# Altium schematic symbol library LATTICEPLDS_Library.SchLib: 291 symbols (part 2 of 32) (continued)
## iCE40LP8K-CM121
designator U?
SPLIT_INST: TRUE; SWAP_INFO: (S1+S2+S3+S4+S5+S6)
part A pins: A1 IOT_225 (io), A2 IOT_222 (io), A3 IOT_223 (io), A4 IOT_211 (io), A5 IOT_207 (io), A6 IOT_206 (io), A7 IOT_192 (io), A8 IOT_190 (io), A9 IOT_178 (io), A10 IOT_170 (io), A11 IOT_168 (io), B3 IOT_221 (io), B4 IOT_219 (io), B5 IOT_208 (io), B6 IOT_198_GBIN0 (io), B7 IOT_197_GBIN1 (io), B8 IOT_177 (io), B9 IOT_174 (io), C7 IOT_191 (io), C8 IOT_179 (io), C9 IOT_172 (io), D5 IOT_212 (io), D6 VCCIO_0 (power), D7 IOT_181 (io)
part B pins: B11 IOR_161 (io), C11 IOR_160 (io), D9 IOR_147 (io), D10 IOR_154 (io), D11 IOR_152 (io), E8 IOR_146 (io), E9 IOR_144 (io), E10 IOR_141_GBIN2 (io), E11 IOR_148 (io), F8 VCCIO_1 (power), F9 IOR_137 (io), F10 IOR_136 (io), F11 IOR_140_GBIN3 (io), G8 IOR_118 (io), G9 IOR_128 (io), G10 IOR_120 (io), G11 IOR_129 (io), H10 IOR_116 (io), H11 IOR_119 (io), J10 IOR_117 (io), J11 IOR_114 (io), K11 IOR_115 (io)
part C pins: H6 VCCIO_2 (power), H7 IOB_87 (io), H9 IOB_104_CBSEL1 (io), J3 IOB_57 (io), J4 IOB_64 (io), J5 IOB_78 (io), J7 IOB_86 (io), J8 IOB_91 (io), K3 IOB_63 (io), K4 IOB_73 (io), K5 IOB_79 (io), K6 IOB_82_GBIN4 (io), K7 IOB_89 (io), K8 CDONE (io), L1 IOB_56 (io), L2 IOB_61 (io), L3 IOB_71 (io), L4 IOB_72 (io), L5 IOB_81_GBIN5 (io), L7 IOB_94 (io), L8 IOB_103_CBSEL0 (io), L9 CRESET_B (io)
part D pins: B1 IOL_2A (io), B2 IOL_2B (io), C1 IOL_5B (io), C2 IOL_5A (io), C3 IOL_4B (io), C4 IOL_4A (io), D1 IOL_8B (io), D2 IOL_9A (io), D3 IOL_9B (io), E1 IOL_8A (io), E2 IOL_10A (io), E3 IOL_10B (io), E4 VCCIO_3 (power), F1 IOL_12A (io), F2 IOL_12B (io), F3 IOL_13B_GBIN7 (io), F4 IOL_13A (io), G1 IOL_14A_GBIN6 (io), G2 IOL_14B (io), G3 IOL_17A (io), G4 VCCIO_3 (power), H1 IOL_18A (io), H2 IOL_18B (io), H3 IOL_17B (io), J1 IOL_23A (io), J2 IOL_25B (io), K1 IOL_23B (io), K2 IOL_25A (io)
part E pins: J9 IOB_106_SDI (io), K9 IOB_105_SDO (io), K10 IOB_108_SS (io), L10 IOB_107_SCK (io), L11 VCC_SPI (power)
part F pins: B10 VPP_FAST (power), C5 GNDPLL1 (power), C6 VCCPLL1 (power), C10 VPP_2V5 (power), D4 VCC (power), D8 VCC (power), E5 GND (power), E6 GND (power), E7 GND (power), F5 GND (power), F6 GND (power), F7 GND (power), G5 GND (power), G6 GND (power), G7 GND (power), H4 VCC (power), H5 GND (power), H8 VCC (power), J6 VCCPLL0 (power), L6 GNDPLL0 (power)
part A text: BANK0
part B text: BANK1
part C text: BANK2
part D text: BANK3
part E text: SPI
part F text: POWER

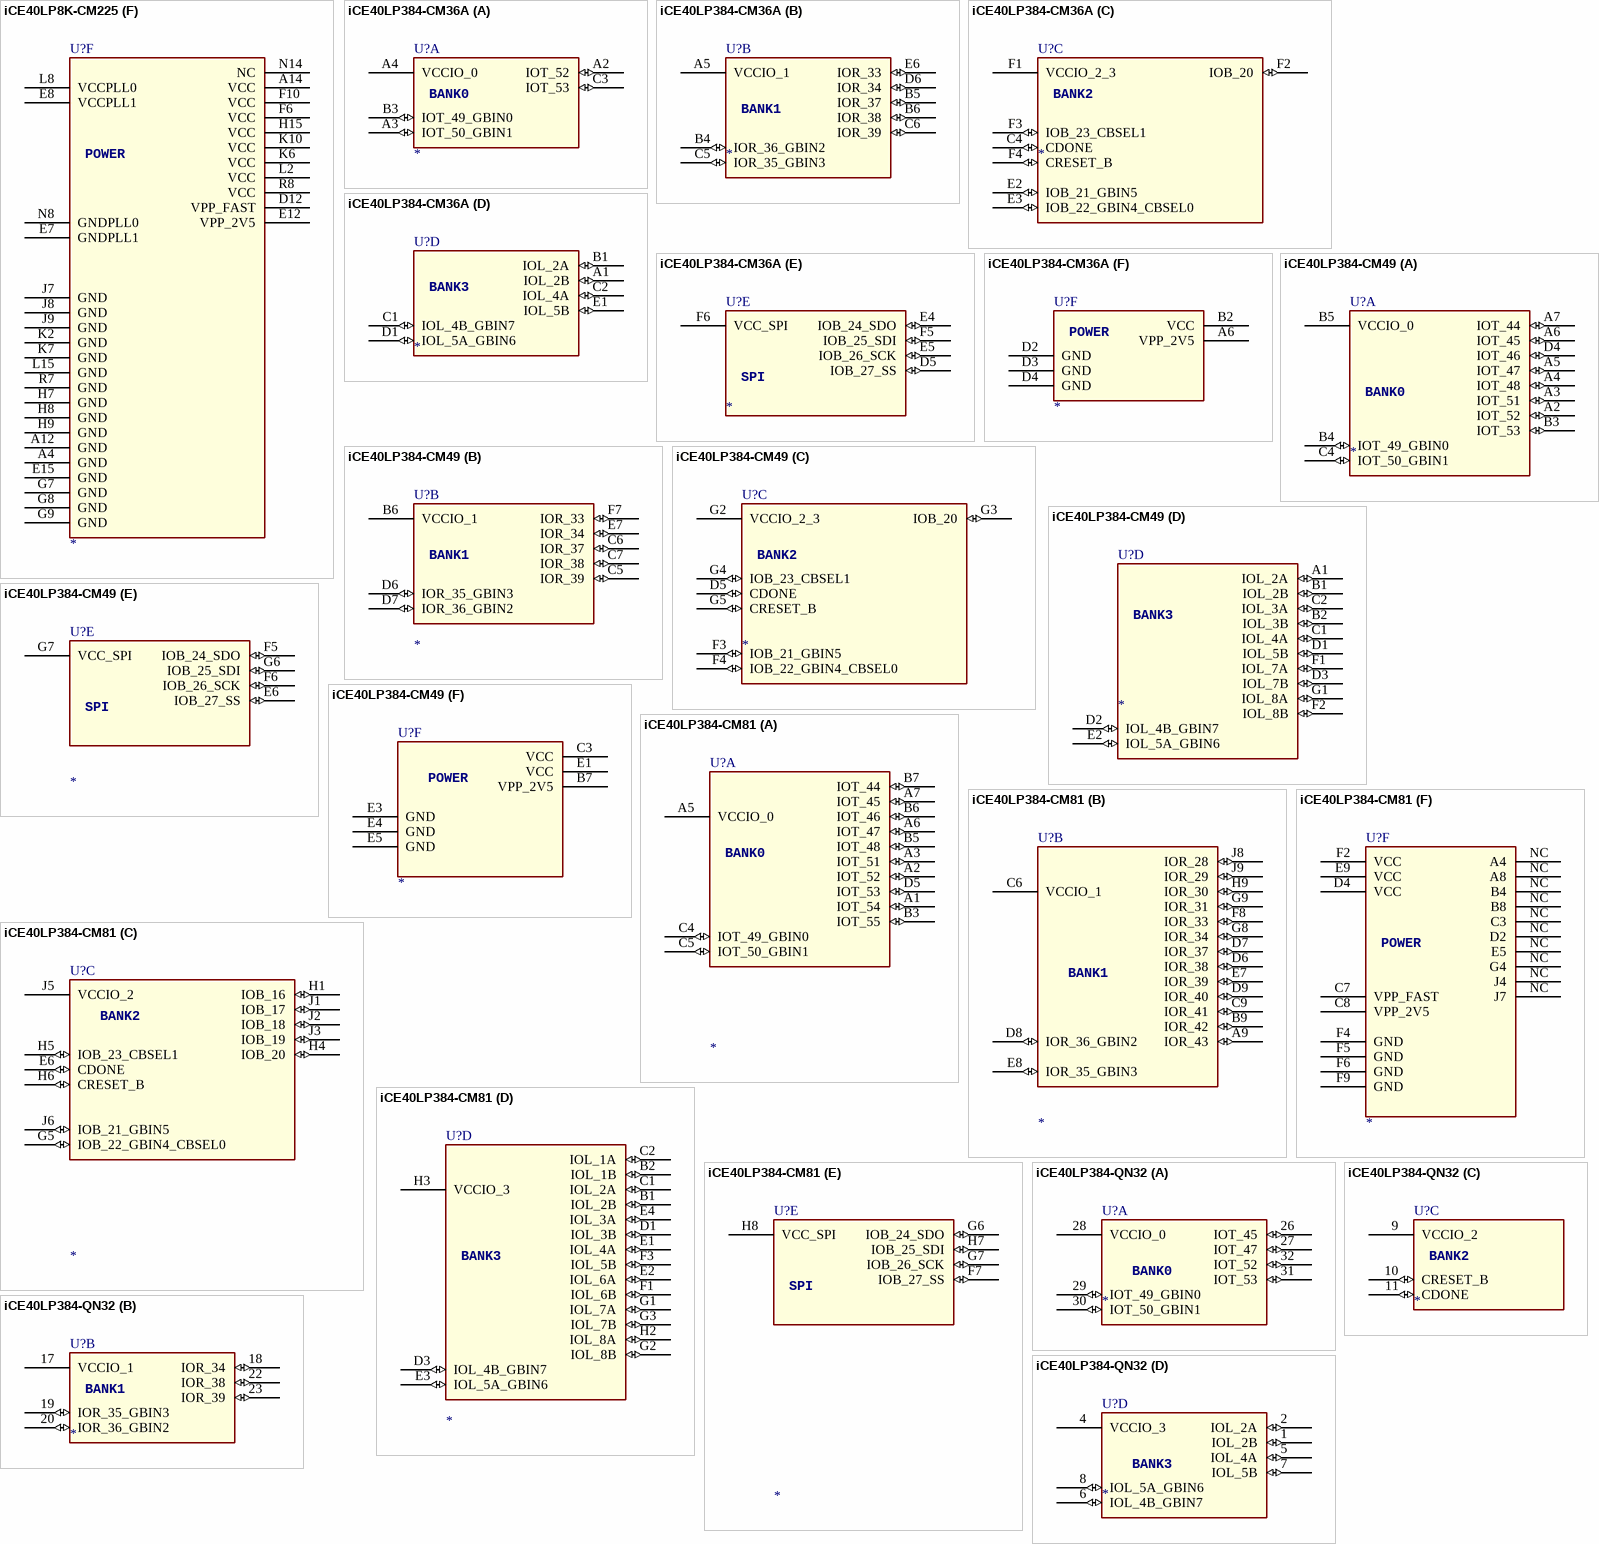
[diagram p14: symbols iCE40LP8K-CM225 to iCE40LP384-QN32]

## iCE40LP8K-CM225
designator U?
SPLIT_INST: TRUE; SWAP_INFO: (S1+S2+S3+S4+S5+S6)
part A pins: A1 IOT_226 (io), A2 IOT_222 (io), A3 VCCIO_0 (power), A5 IOT_216 (io), A6 IOT_207 (io), A7 IOT_205 (io), A8 IOT_196 (io), A9 IOT_194 (io), A10 IOT_189 (io), A11 IOT_184 (io), A13 VCCIO_0 (power), A15 IOT_169 (io), B2 IOT_224 (io), B3 IOT_220 (io), B4 IOT_218 (io), B5 IOT_214 (io), B6 IOT_209 (io), B7 IOT_201 (io), B8 IOT_192 (io), B9 IOT_195 (io), B10 IOT_187 (io), B11 IOT_185 (io), B12 IOT_180 (io), B13 IOT_176 (io), B14 IOT_168 (io), C3 IOT_225 (io), C4 IOT_223 (io), C5 IOT_219 (io), C6 IOT_203 (io), C7 IOT_206 (io), C8 IOT_193 (io), C9 IOT_197_GBIN1 (io), C10 IOT_191 (io), C11 IOT_182 (io), C12 IOT_170 (io), C13 IOT_171 (io), D5 IOT_221 (io), D6 IOT_211 (io), D7 IOT_208 (io), D8 IOT_198_GBIN0 (io), D9 IOT_178 (io), D10 IOT_181 (io), D11 IOT_174 (io), E9 IOT_179 (io), E10 IOT_177 (io), E11 IOT_172 (io), F7 IOT_212 (io), F8 VCCIO_0 (power), F9 IOT_190 (io)
part B pins: B15 IOR_167 (io), C14 IOR_165 (io), C15 VCCIO_1 (power), D13 IOR_160 (io), D14 IOR_155 (io), D15 IOR_159 (io), E13 IOR_161 (io), E14 IOR_153 (io), F11 IOR_154 (io), F12 IOR_152 (io), F13 IOR_151 (io), F14 IOR_147 (io), F15 IOR_149 (io), G10 IOR_146 (io), G11 IOR_144 (io), G12 IOR_148 (io), G13 IOR_141_GBIN2 (io), G14 IOR_145 (io), G15 IOR_143 (io), H10 VCCIO_1 (power), H11 IOR_136 (io), H12 IOR_140_GBIN3 (io), H13 IOR_138 (io), H14 IOR_137 (io), J10 IOR_118 (io), J11 IOR_128 (io), J12 IOR_120 (io), J13 IOR_129 (io), J14 IOR_135 (io), J15 IOR_133 (io), K12 IOR_116 (io), K13 IOR_117 (io), K14 IOR_131 (io), K15 IOR_125 (io), L12 IOR_114 (io), L13 IOR_119 (io), L14 IOR_121 (io), M13 IOR_115 (io), M14 IOR_123 (io), M15 IOR_113 (io), N15 VCCIO_1 (power), P14 IOR_112 (io), P15 IOR_110 (io), R14 IOR_111 (io), R15 IOR_109 (io)
part C pins: K8 VCCIO_2 (power), K9 IOB_87 (io), K11 IOB_103_CBSEL0 (io), L5 IOB_56 (io), L6 IOB_62 (io), L7 IOB_72 (io), L9 IOB_82_GBIN4 (io), L10 IOB_89 (io), M5 IOB_60 (io), M6 IOB_64 (io), M7 IOB_75 (io), M8 IOB_78 (io), M9 IOB_85 (io), M10 CDONE (io), N3 IOB_52 (io), N4 IOB_54 (io), N5 IOB_67 (io), N6 IOB_73 (io), N7 IOB_81_GBIN5 (io), N9 IOB_86 (io), N10 IOB_91 (io), N11 CRESET_B (io), P2 IOB_53 (io), P3 VCCIO_2 (power), P4 IOB_63 (io), P5 IOB_69 (io), P6 IOB_77 (io), P7 IOB_83 (io), P8 IOB_84 (io), P9 IOB_90 (io), P10 IOB_92 (io), P11 IOB_96 (io), P12 IOB_104_CBSEL1 (io), P13 IOB_100 (io), R1 IOB_55 (io), R2 IOB_57 (io), R3 IOB_61 (io), R4 IOB_65 (io), R5 IOB_71 (io), R6 IOB_79 (io), R9 IOB_88 (io), R10 IOB_94 (io), R11 IOB_98 (io), R12 IOB_102 (io), R13 VCCIO_2 (power)
part D pins: B1 IOL_1B (io), C1 IOL_3B (io), C2 IOL_1A (io), D1 IOL_5B (io), D2 IOL_6A (io), D3 IOL_4B (io), D4 IOL_2B (io), E1 VCCIO_3 (power), E2 IOL_6B (io), E3 IOL_3A (io), E4 IOL_2A (io), E5 IOL_4A (io), E6 IOL_5A (io), F1 IOL_10B (io), F2 IOL_9B (io), F3 IOL_9A (io), F4 IOL_8B (io), F5 IOL_8A (io), G1 IOL_11B (io), G2 IOL_10A (io), G3 IOL_11A (io), G4 IOL_13B_GBIN7 (io), G5 IOL_12A (io), G6 VCCIO_3 (power), H1 IOL_14B (io), H2 IOL_12B (io), H3 IOL_15A (io), H4 IOL_16A (io), H5 IOL_14A_GBIN6 (io), H6 IOL_13A (io), J1 IOL_16B (io), J2 IOL_17B (io), J3 IOL_15B (io), J4 IOL_18A (io), J5 IOL_17A (io), J6 VCCIO_3 (power), K1 IOL_18B (io), K3 IOL_20A (io), K4 IOL_25B (io), K5 IOL_23A (io), L1 IOL_20B (io), L3 IOL_22A (io), L4 IOL_26B (io), M1 IOL_22B (io), M2 IOL_23B (io), M3 IOL_24B (io), M4 IOL_26A (io), N1 VCCIO_3 (power), N2 IOL_24A (io), P1 IOL_25A (io)
part E pins: L11 IOB_106_SDI (io), M11 IOB_105_SDO (io), M12 IOB_108_SS (io), N12 IOB_107_SCK (io), N13 VCC_SPI (power)
part F pins: A4 GND (power), A12 GND (power), A14 VCC (power), D12 VPP_FAST (power), E7 GNDPLL1 (power), E8 VCCPLL1 (power), E12 VPP_2V5 (power), E15 GND (power), F6 VCC (power), F10 VCC (power), G7 GND (power), G8 GND (power), G9 GND (power), H7 GND (power), H8 GND (power), H9 GND (power), H15 VCC (power), J7 GND (power), J8 GND (power), J9 GND (power), K2 GND (power), K6 VCC (power), K7 GND (power), K10 VCC (power), L2 VCC (power), L8 VCCPLL0 (power), L15 GND (power), N8 GNDPLL0 (power), N14 NC (power), R7 GND (power), R8 VCC (power)
part A text: BANK0
part B text: BANK1
part C text: BANK2
part D text: BANK3
part E text: SPI
part F text: POWER

## iCE40LP384-CM36A
designator U?
SPLIT_INST: TRUE; SWAP_INFO: (S1+S2+S3+S4+S5+S6)
part A pins: A2 IOT_52 (io), A3 IOT_50_GBIN1 (io), A4 VCCIO_0 (power), B3 IOT_49_GBIN0 (io), C3 IOT_53 (io)
part B pins: A5 VCCIO_1 (power), B4 IOR_36_GBIN2 (io), B5 IOR_37 (io), B6 IOR_38 (io), C5 IOR_35_GBIN3 (io), C6 IOR_39 (io), D6 IOR_34 (io), E6 IOR_33 (io)
part C pins: C4 CDONE (io), E2 IOB_21_GBIN5 (io), E3 IOB_22_GBIN4_CBSEL0 (io), F1 VCCIO_2_3 (power), F2 IOB_20 (io), F3 IOB_23_CBSEL1 (io), F4 CRESET_B (io)
part D pins: A1 IOL_2B (io), B1 IOL_2A (io), C1 IOL_4B_GBIN7 (io), C2 IOL_4A (io), D1 IOL_5A_GBIN6 (io), E1 IOL_5B (io)
part E pins: D5 IOB_27_SS (io), E4 IOB_24_SDO (io), E5 IOB_26_SCK (io), F5 IOB_25_SDI (io), F6 VCC_SPI (power)
part F pins: A6 VPP_2V5 (power), B2 VCC (power), D2 GND (power), D3 GND (power), D4 GND (power)
part A text: BANK0
part B text: BANK1
part C text: BANK2
part D text: BANK3
part E text: SPI
part F text: POWER

## iCE40LP384-CM49
designator U?
SPLIT_INST: TRUE; SWAP_INFO: (S1+S2+S3+S4+S5+S6)
part A pins: A2 IOT_52 (io), A3 IOT_51 (io), A4 IOT_48 (io), A5 IOT_47 (io), A6 IOT_45 (io), A7 IOT_44 (io), B3 IOT_53 (io), B4 IOT_49_GBIN0 (io), B5 VCCIO_0 (power), C4 IOT_50_GBIN1 (io), D4 IOT_46 (io)
part B pins: B6 VCCIO_1 (power), C5 IOR_39 (io), C6 IOR_37 (io), C7 IOR_38 (io), D6 IOR_35_GBIN3 (io), D7 IOR_36_GBIN2 (io), E7 IOR_34 (io), F7 IOR_33 (io)
part C pins: D5 CDONE (io), F3 IOB_21_GBIN5 (io), F4 IOB_22_GBIN4_CBSEL0 (io), G2 VCCIO_2_3 (power), G3 IOB_20 (io), G4 IOB_23_CBSEL1 (io), G5 CRESET_B (io)
part D pins: A1 IOL_2A (io), B1 IOL_2B (io), B2 IOL_3B (io), C1 IOL_4A (io), C2 IOL_3A (io), D1 IOL_5B (io), D2 IOL_4B_GBIN7 (io), D3 IOL_7B (io), E2 IOL_5A_GBIN6 (io), F1 IOL_7A (io), F2 IOL_8B (io), G1 IOL_8A (io)
part E pins: E6 IOB_27_SS (io), F5 IOB_24_SDO (io), F6 IOB_26_SCK (io), G6 IOB_25_SDI (io), G7 VCC_SPI (power)
part F pins: B7 VPP_2V5 (power), C3 VCC (power), E1 VCC (power), E3 GND (power), E4 GND (power), E5 GND (power)
part A text: BANK0
part B text: BANK1
part C text: BANK2
part D text: BANK3
part E text: SPI
part F text: POWER

## iCE40LP384-CM81
designator U?
SPLIT_INST: TRUE; SWAP_INFO: (S1+S2+S3+S4+S5+S6)
part A pins: A1 IOT_54 (io), A2 IOT_52 (io), A3 IOT_51 (io), A5 VCCIO_0 (power), A6 IOT_47 (io), A7 IOT_45 (io), B3 IOT_55 (io), B5 IOT_48 (io), B6 IOT_46 (io), B7 IOT_44 (io), C4 IOT_49_GBIN0 (io), C5 IOT_50_GBIN1 (io), D5 IOT_53 (io)
part B pins: A9 IOR_43 (io), B9 IOR_42 (io), C6 VCCIO_1 (power), C9 IOR_41 (io), D6 IOR_38 (io), D7 IOR_37 (io), D8 IOR_36_GBIN2 (io), D9 IOR_40 (io), E7 IOR_39 (io), E8 IOR_35_GBIN3 (io), F8 IOR_33 (io), G8 IOR_34 (io), G9 IOR_31 (io), H9 IOR_30 (io), J8 IOR_28 (io), J9 IOR_29 (io)
part C pins: E6 CDONE (io), G5 IOB_22_GBIN4_CBSEL0 (io), H1 IOB_16 (io), H4 IOB_20 (io), H5 IOB_23_CBSEL1 (io), H6 CRESET_B (io), J1 IOB_17 (io), J2 IOB_18 (io), J3 IOB_19 (io), J5 VCCIO_2 (power), J6 IOB_21_GBIN5 (io)
part D pins: B1 IOL_2B (io), B2 IOL_1B (io), C1 IOL_2A (io), C2 IOL_1A (io), D1 IOL_3B (io), D3 IOL_4B_GBIN7 (io), E1 IOL_4A (io), E2 IOL_6A (io), E3 IOL_5A_GBIN6 (io), E4 IOL_3A (io), F1 IOL_6B (io), F3 IOL_5B (io), G1 IOL_7A (io), G2 IOL_8B (io), G3 IOL_7B (io), H2 IOL_8A (io), H3 VCCIO_3 (power)
part E pins: F7 IOB_27_SS (io), G6 IOB_24_SDO (io), G7 IOB_26_SCK (io), H7 IOB_25_SDI (io), H8 VCC_SPI (power)
part F pins: C7 VPP_FAST (power), C8 VPP_2V5 (power), D4 VCC (power), E9 VCC (power), F2 VCC (power), F4 GND (power), F5 GND (power), F6 GND (power), F9 GND (power), NC A4 (power), NC A8 (power), NC B4 (power), NC B8 (power), NC C3 (power), NC D2 (power), NC E5 (power), NC G4 (power), NC J4 (power), NC J7 (power)
part A text: BANK0
part B text: BANK1
part C text: BANK2
part D text: BANK3
part E text: SPI
part F text: POWER

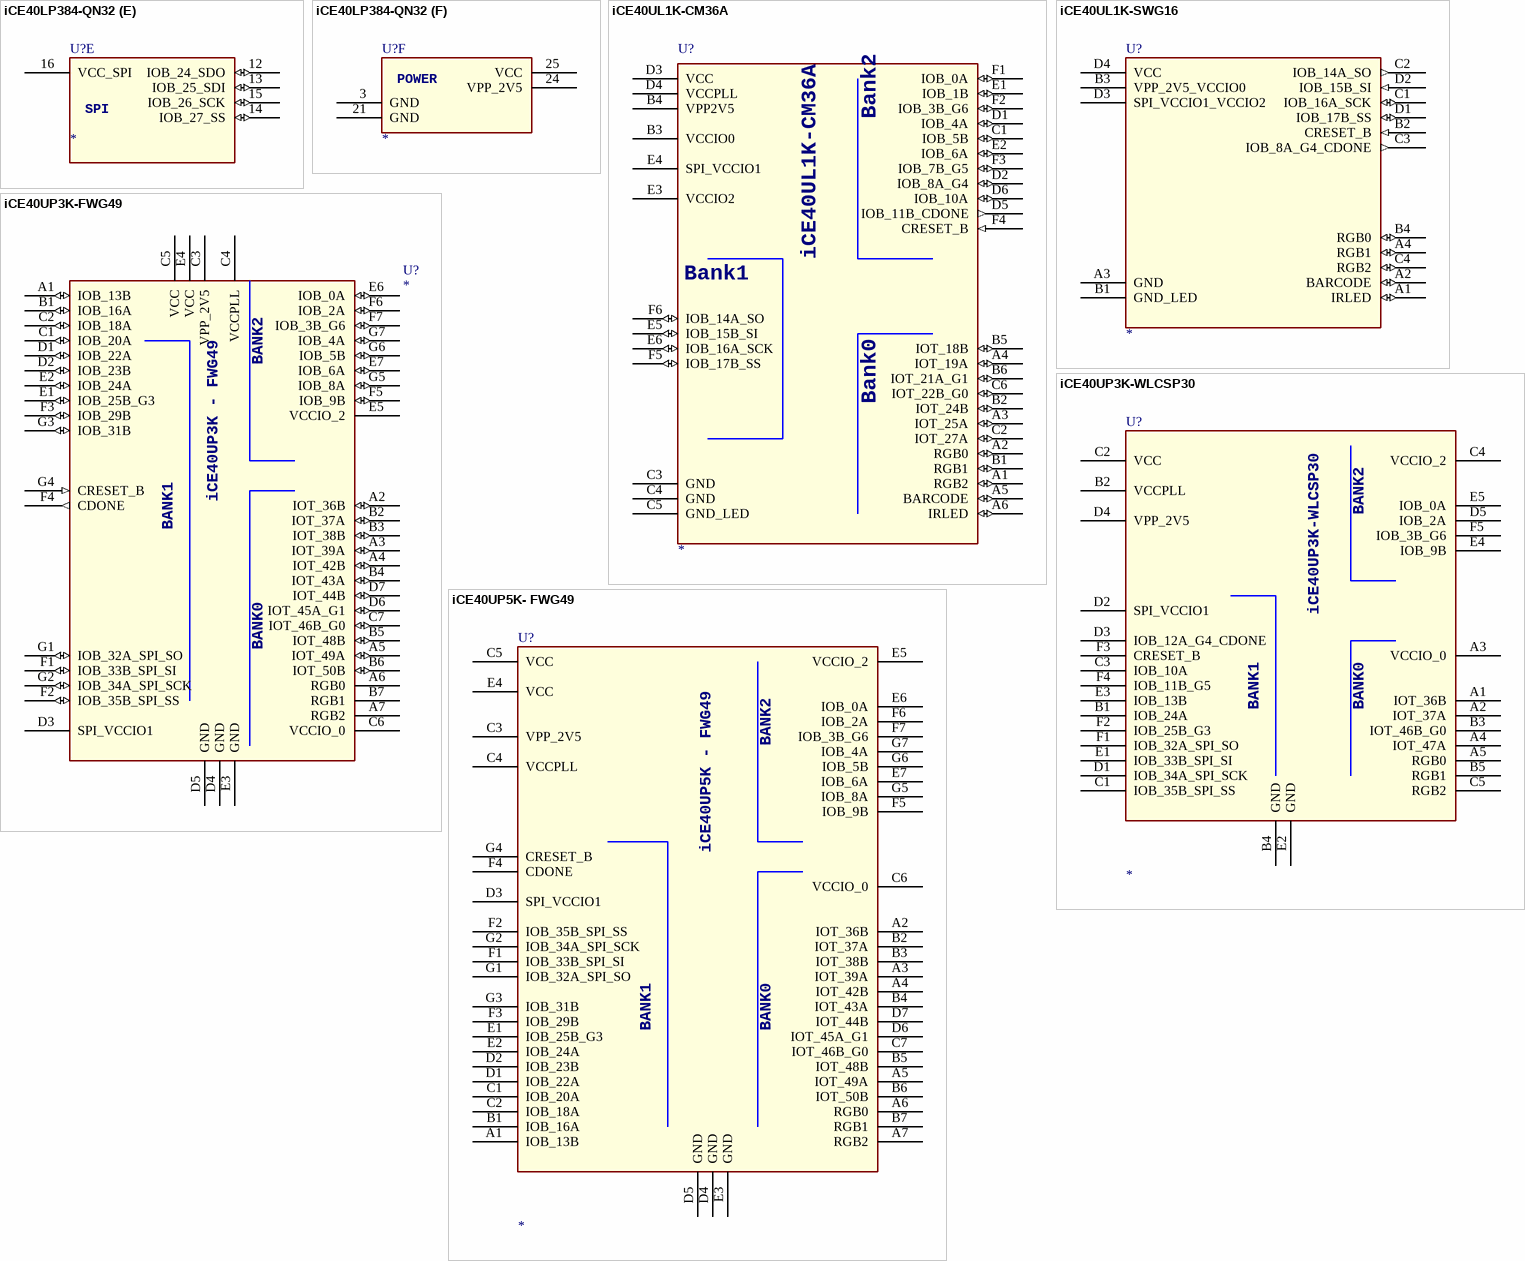
[diagram p15: symbols iCE40LP384-QN32 to iCE40UP5K- FWG49]

## iCE40LP384-QN32
designator U?
SPLIT_INST: TRUE; SWAP_INFO: (S1+S2+S3+S4+S5+S6)
part A pins: 26 IOT_45 (io), 27 IOT_47 (io), 28 VCCIO_0 (power), 29 IOT_49_GBIN0 (io), 30 IOT_50_GBIN1 (io), 31 IOT_53 (io), 32 IOT_52 (io)
part B pins: 17 VCCIO_1 (power), 18 IOR_34 (io), 19 IOR_35_GBIN3 (io), 20 IOR_36_GBIN2 (io), 22 IOR_38 (io), 23 IOR_39 (io)
part C pins: 9 VCCIO_2 (power), 10 CRESET_B (io), 11 CDONE (io)
part D pins: 1 IOL_2B (io), 2 IOL_2A (io), 4 VCCIO_3 (power), 5 IOL_4A (io), 6 IOL_4B_GBIN7 (io), 7 IOL_5B (io), 8 IOL_5A_GBIN6 (io)
part E pins: 12 IOB_24_SDO (io), 13 IOB_25_SDI (io), 14 IOB_27_SS (io), 15 IOB_26_SCK (io), 16 VCC_SPI (power)
part F pins: 3 GND (power), 21 GND (power), 24 VPP_2V5 (power), 25 VCC (power)
part A text: BANK0
part B text: BANK1
part C text: BANK2
part D text: BANK3
part E text: SPI
part F text: POWER

## iCE40UL1K-CM36A
designator U?
pins: A1 RGB2 (io), A2 RGB0 (io), A3 IOT_25A (io), A4 IOT_19A (io), A5 BARCODE (io), A6 IRLED (io), B1 RGB1 (io), B2 IOT_24B (io), B3 VCCIO0 (power), B4 VPP2V5 (power), B5 IOT_18B (io), B6 IOT_21A_G1 (io), C1 IOB_5B (io), C2 IOT_27A (io), C3 GND (power), C4 GND (power), C5 GND_LED (power), C6 IOT_22B_G0 (io), D1 IOB_4A (io), D2 IOB_8A_G4 (io), D3 VCC (power), D4 VCCPLL (power), D5 IOB_11B_CDONE (out), D6 IOB_10A (io), E1 IOB_1B (io), E2 IOB_6A (io), E3 VCCIO2 (power), E4 SPI_VCCIO1 (power), E5 IOB_15B_SI (io), E6 IOB_16A_SCK (io), F1 IOB_0A (io), F2 IOB_3B_G6 (io), F3 IOB_7B_G5 (io), F4 CRESET_B (in), F5 IOB_17B_SS (io), F6 IOB_14A_SO (io)
text: Bank2; Bank1; Bank0

## iCE40UL1K-SWG16
designator U?
pins: A1 IRLED (io), A2 BARCODE (io), A3 GND (power), A4 RGB1 (io), B1 GND_LED (power), B2 CRESET_B (in), B3 VPP_2V5_VCCIO0 (power), B4 RGB0 (io), C1 IOB_16A_SCK (io), C2 IOB_14A_SO (out), C3 IOB_8A_G4_CDONE (out), C4 RGB2 (io), D1 IOB_17B_SS (io), D2 IOB_15B_SI (in), D3 SPI_VCCIO1_VCCIO2 (power), D4 VCC (power)

## iCE40UP3K-FWG49
designator U?
pins: A1 IOB_13B (io), A2 IOT_36B (io), A3 IOT_39A (io), A4 IOT_42B (io), A5 IOT_49A (io), A6 RGB0 (oc), A7 RGB2 (oc), B1 IOB_16A (io), B2 IOT_37A (io), B3 IOT_38B (io), B4 IOT_43A (io), B5 IOT_48B (io), B6 IOT_50B (io), B7 RGB1 (oc), C1 IOB_20A (io), C2 IOB_18A (io), C3 VPP_2V5 (power), C4 VCCPLL (power), C5 VCC (power), C6 VCCIO_0 (power), C7 IOT_46B_G0 (io), D1 IOB_22A (io), D2 IOB_23B (io), D3 SPI_VCCIO1 (power), D4 GND (power), D5 GND (power), D6 IOT_45A_G1 (io), D7 IOT_44B (io), E1 IOB_25B_G3 (io), E2 IOB_24A (io), E3 GND (power), E4 VCC (power), E5 VCCIO_2 (power), E6 IOB_0A (io), E7 IOB_6A (io), F1 IOB_33B_SPI_SI (io), F2 IOB_35B_SPI_SS (io), F3 IOB_29B (io), F4 CDONE (out), F5 IOB_9B (io), F6 IOB_2A (io), F7 IOB_3B_G6 (io), G1 IOB_32A_SPI_SO (io), G2 IOB_34A_SPI_SCK (io), G3 IOB_31B (io), G4 CRESET_B (in), G5 IOB_8A (io), G6 IOB_5B (io), G7 IOB_4A (io)
text: BANK2; iCE40UP3K - FWG49; BANK1; BANK0

## iCE40UP3K-WLCSP30
designator U?
pins: A1 IOT_36B, A2 IOT_37A, A3 VCCIO_0 (power), A4 IOT_47A, A5 RGB0 (oc), B1 IOB_24A, B2 VCCPLL (power), B3 IOT_46B_G0, B4 GND (power), B5 RGB1 (oc), C1 IOB_35B_SPI_SS, C2 VCC (power), C3 IOB_10A, C4 VCCIO_2 (power), C5 RGB2 (oc), D1 IOB_34A_SPI_SCK, D2 SPI_VCCIO1 (power), D3 IOB_12A_G4_CDONE, D4 VPP_2V5 (power), D5 IOB_2A, E1 IOB_33B_SPI_SI, E2 GND (power), E3 IOB_13B, E4 IOB_9B, E5 IOB_0A, F1 IOB_32A_SPI_SO, F2 IOB_25B_G3, F3 CRESET_B, F4 IOB_11B_G5, F5 IOB_3B_G6
text: BANK2; BANK1; BANK0

## iCE40UP5K- FWG49
designator U?
pins: A1 IOB_13B, A2 IOT_36B, A3 IOT_39A, A4 IOT_42B, A5 IOT_49A, A6 RGB0 (oc), A7 RGB2 (oc), B1 IOB_16A, B2 IOT_37A, B3 IOT_38B, B4 IOT_43A, B5 IOT_48B, B6 IOT_50B, B7 RGB1 (oc), C1 IOB_20A, C2 IOB_18A, C3 VPP_2V5 (power), C4 VCCPLL, C5 VCC (power), C6 VCCIO_0 (power), C7 IOT_46B_G0, D1 IOB_22A, D2 IOB_23B, D3 SPI_VCCIO1 (power), D4 GND (power), D5 GND (power), D6 IOT_45A_G1, D7 IOT_44B, E1 IOB_25B_G3, E2 IOB_24A, E3 GND (power), E4 VCC (power), E5 VCCIO_2 (power), E6 IOB_0A, E7 IOB_6A, F1 IOB_33B_SPI_SI, F2 IOB_35B_SPI_SS, F3 IOB_29B, F4 CDONE, F5 IOB_9B, F6 IOB_2A, F7 IOB_3B_G6, G1 IOB_32A_SPI_SO, G2 IOB_34A_SPI_SCK, G3 IOB_31B, G4 CRESET_B, G5 IOB_8A, G6 IOB_5B, G7 IOB_4A
text: BANK2; iCE40UP5K - FWG49; BANK1; BANK0

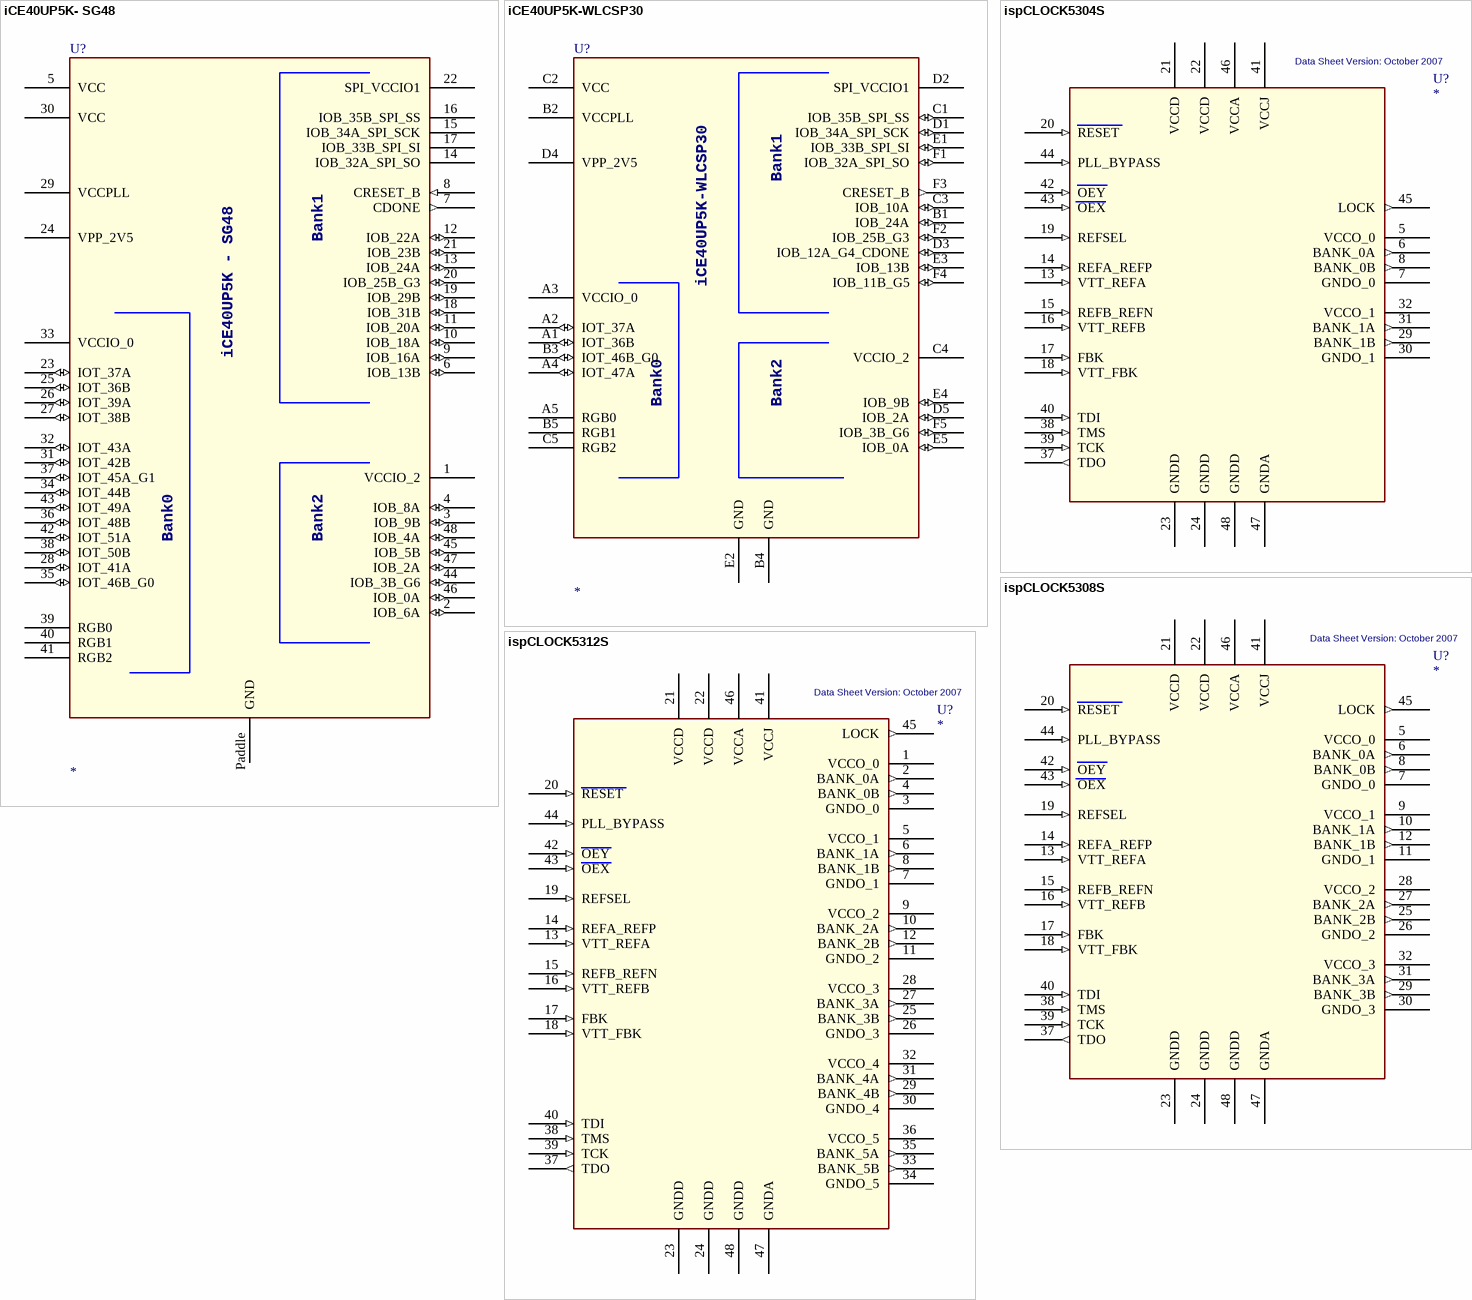
[diagram p16: symbols iCE40UP5K- SG48 to ispCLOCK5312S]

## iCE40UP5K- SG48
designator U?
pins: 1 VCCIO_2 (power), 2 IOB_6A (io), 3 IOB_9B (io), 4 IOB_8A (io), 5 VCC (power), 6 IOB_13B (io), 7 CDONE (out), 8 CRESET_B (in), 9 IOB_16A (io), 10 IOB_18A (io), 11 IOB_20A (io), 12 IOB_22A (io), 13 IOB_24A (io), 14 IOB_32A_SPI_SO, 15 IOB_34A_SPI_SCK, 16 IOB_35B_SPI_SS, 17 IOB_33B_SPI_SI, 18 IOB_31B (io), 19 IOB_29B (io), 20 IOB_25B_G3 (io), 21 IOB_23B (io), 22 SPI_VCCIO1 (power), 23 IOT_37A (io), 24 VPP_2V5 (power), 25 IOT_36B (io), 26 IOT_39A (io), 27 IOT_38B (io), 28 IOT_41A (io), 29 VCCPLL (power), 30 VCC (power), 31 IOT_42B (io), 32 IOT_43A (io), 33 VCCIO_0 (power), 34 IOT_44B (io), 35 IOT_46B_G0 (io), 36 IOT_48B (io), 37 IOT_45A_G1 (io), 38 IOT_50B (io), 39 RGB0 (oc), 40 RGB1 (oc), 41 RGB2 (oc), 42 IOT_51A (io), 43 IOT_49A (io), 44 IOB_3B_G6 (io), 45 IOB_5B (io), 46 IOB_0A (io), 47 IOB_2A (io), 48 IOB_4A (io), Paddle GND (power)
text: Bank1; iCE40UP5K - SG48; Bank0; Bank2

## iCE40UP5K-WLCSP30
designator U?
pins: A1 IOT_36B (io), A2 IOT_37A (io), A3 VCCIO_0 (power), A4 IOT_47A (io), A5 RGB0 (oc), B1 IOB_24A (io), B2 VCCPLL (power), B3 IOT_46B_G0 (io), B4 GND (power), B5 RGB1 (oc), C1 IOB_35B_SPI_SS (io), C2 VCC (power), C3 IOB_10A (io), C4 VCCIO_2 (power), C5 RGB2 (oc), D1 IOB_34A_SPI_SCK (io), D2 SPI_VCCIO1 (power), D3 IOB_12A_G4_CDONE (io), D4 VPP_2V5 (power), D5 IOB_2A (io), E1 IOB_33B_SPI_SI (io), E2 GND (power), E3 IOB_13B (io), E4 IOB_9B (io), E5 IOB_0A (io), F1 IOB_32A_SPI_SO (io), F2 IOB_25B_G3 (io), F3 CRESET_B (out), F4 IOB_11B_G5 (io), F5 IOB_3B_G6 (io)
text: Bank1; Bank0; Bank2

## ispCLOCK5304S
designator U?  Data Sheet Version: October 2007
pins: 5 VCCO_0 (power), 6 BANK_0A (out), 7 GNDO_0 (power), 8 BANK_0B (out), 13 VTT_REFA (in), 14 REFA_REFP (in), 15 REFB_REFN (in), 16 VTT_REFB (in), 17 FBK (in), 18 VTT_FBK (in), 19 REFSEL (in), 20 RESET (in), 21 VCCD (power), 22 VCCD (power), 23 GNDD (power), 24 GNDD (power), 29 BANK_1B (out), 30 GNDO_1 (power), 31 BANK_1A (out), 32 VCCO_1 (power), 37 TDO (out), 38 TMS (in), 39 TCK (in), 40 TDI (in), 41 VCCJ (power), 42 OEY (in), 43 OEX (in), 44 PLL_BYPASS (in), 45 LOCK (out), 46 VCCA (power), 47 GNDA (power), 48 GNDD (power)

## ispCLOCK5308S
designator U?  Data Sheet Version: October 2007
pins: 5 VCCO_0 (power), 6 BANK_0A (out), 7 GNDO_0 (power), 8 BANK_0B (out), 9 VCCO_1 (power), 10 BANK_1A (out), 11 GNDO_1 (power), 12 BANK_1B (out), 13 VTT_REFA (in), 14 REFA_REFP (in), 15 REFB_REFN (in), 16 VTT_REFB (in), 17 FBK (in), 18 VTT_FBK (in), 19 REFSEL (in), 20 RESET (in), 21 VCCD (power), 22 VCCD (power), 23 GNDD (power), 24 GNDD (power), 25 BANK_2B (out), 26 GNDO_2 (power), 27 BANK_2A (out), 28 VCCO_2 (power), 29 BANK_3B (out), 30 GNDO_3 (power), 31 BANK_3A (out), 32 VCCO_3 (power), 37 TDO (out), 38 TMS (in), 39 TCK (in), 40 TDI (in), 41 VCCJ (power), 42 OEY (in), 43 OEX (in), 44 PLL_BYPASS (in), 45 LOCK (out), 46 VCCA (power), 47 GNDA (power), 48 GNDD (power)

## ispCLOCK5312S
designator U?  Data Sheet Version: October 2007
pins: 1 VCCO_0 (power), 2 BANK_0A (out), 3 GNDO_0 (power), 4 BANK_0B (out), 5 VCCO_1 (power), 6 BANK_1A (out), 7 GNDO_1 (power), 8 BANK_1B (out), 9 VCCO_2 (power), 10 BANK_2A (out), 11 GNDO_2 (power), 12 BANK_2B (out), 13 VTT_REFA (in), 14 REFA_REFP (in), 15 REFB_REFN (in), 16 VTT_REFB (in), 17 FBK (in), 18 VTT_FBK (in), 19 REFSEL (in), 20 RESET (in), 21 VCCD (power), 22 VCCD (power), 23 GNDD (power), 24 GNDD (power), 25 BANK_3B (out), 26 GNDO_3 (power), 27 BANK_3A (out), 28 VCCO_3 (power), 29 BANK_4B (out), 30 GNDO_4 (power), 31 BANK_4A (out), 32 VCCO_4 (power), 33 BANK_5B (out), 34 GNDO_5 (power), 35 BANK_5A (out), 36 VCCO_5 (power), 37 TDO (out), 38 TMS (in), 39 TCK (in), 40 TDI (in), 41 VCCJ (power), 42 OEY (in), 43 OEX (in), 44 PLL_BYPASS (in), 45 LOCK (out), 46 VCCA (power), 47 GNDA (power), 48 GNDD (power)

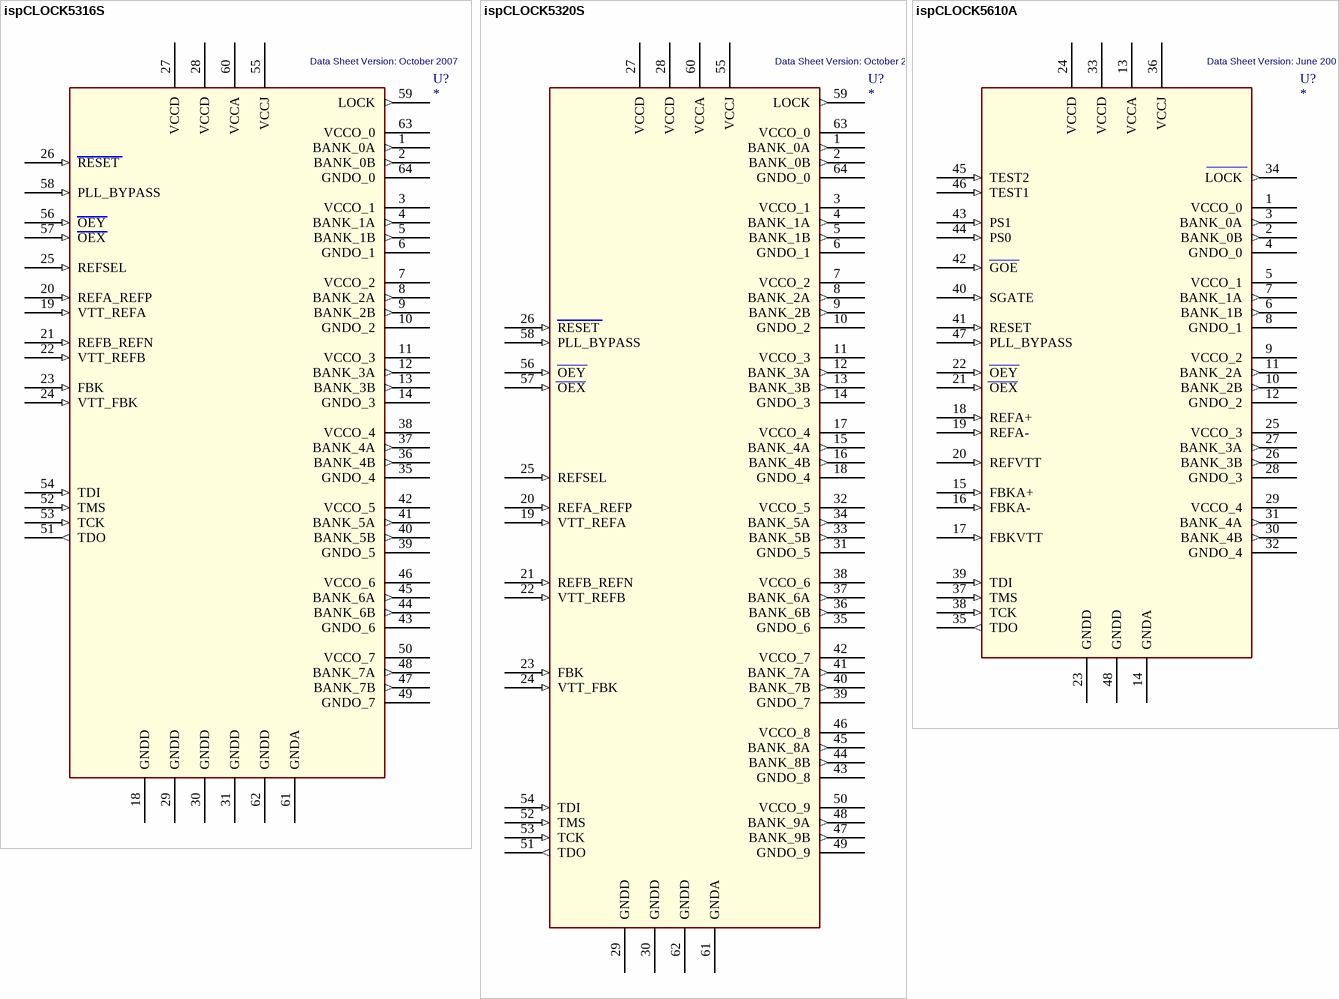
[diagram p17: symbols ispCLOCK5316S to ispCLOCK5610A]

## ispCLOCK5316S
designator U?  Data Sheet Version: October 2007
pins: 1 BANK_0A (out), 2 BANK_0B (out), 3 VCCO_1 (power), 4 BANK_1A (out), 5 BANK_1B (out), 6 GNDO_1 (power), 7 VCCO_2 (power), 8 BANK_2A (out), 9 BANK_2B (out), 10 GNDO_2 (power), 11 VCCO_3 (power), 12 BANK_3A (out), 13 BANK_3B (out), 14 GNDO_3 (power), 18 GNDD (power), 19 VTT_REFA (in), 20 REFA_REFP (in), 21 REFB_REFN (in), 22 VTT_REFB (in), 23 FBK (in), 24 VTT_FBK (in), 25 REFSEL (in), 26 RESET (in), 27 VCCD (power), 28 VCCD (power), 29 GNDD (power), 30 GNDD (power), 31 GNDD (power), 35 GNDO_4 (power), 36 BANK_4B (out), 37 BANK_4A (out), 38 VCCO_4 (power), 39 GNDO_5 (power), 40 BANK_5B (out), 41 BANK_5A (out), 42 VCCO_5 (power), 43 GNDO_6 (power), 44 BANK_6B (out), 45 BANK_6A (out), 46 VCCO_6 (power), 47 BANK_7B (out), 48 BANK_7A (out), 49 GNDO_7 (power), 50 VCCO_7 (power), 51 TDO (out), 52 TMS (in), 53 TCK (in), 54 TDI (in), 55 VCCJ (power), 56 OEY (in), 57 OEX (in), 58 PLL_BYPASS (in), 59 LOCK (out), 60 VCCA (power), 61 GNDA (power), 62 GNDD (power), 63 VCCO_0 (power), 64 GNDO_0 (power)